# Altium footprint library Maxwell_LIB.PcbLib: 143 footprints (part 1 of 9)
Each footprint in its own frame and in the unit in brackets; x right, y up, seen from the top. Pads: shape width x height; smd on the part's side, far side on the other; paste and mask are expansions set on the pad; w line width, h text height; cw(c..) or ccw(c..) is an arc to the next point about the centre after c.
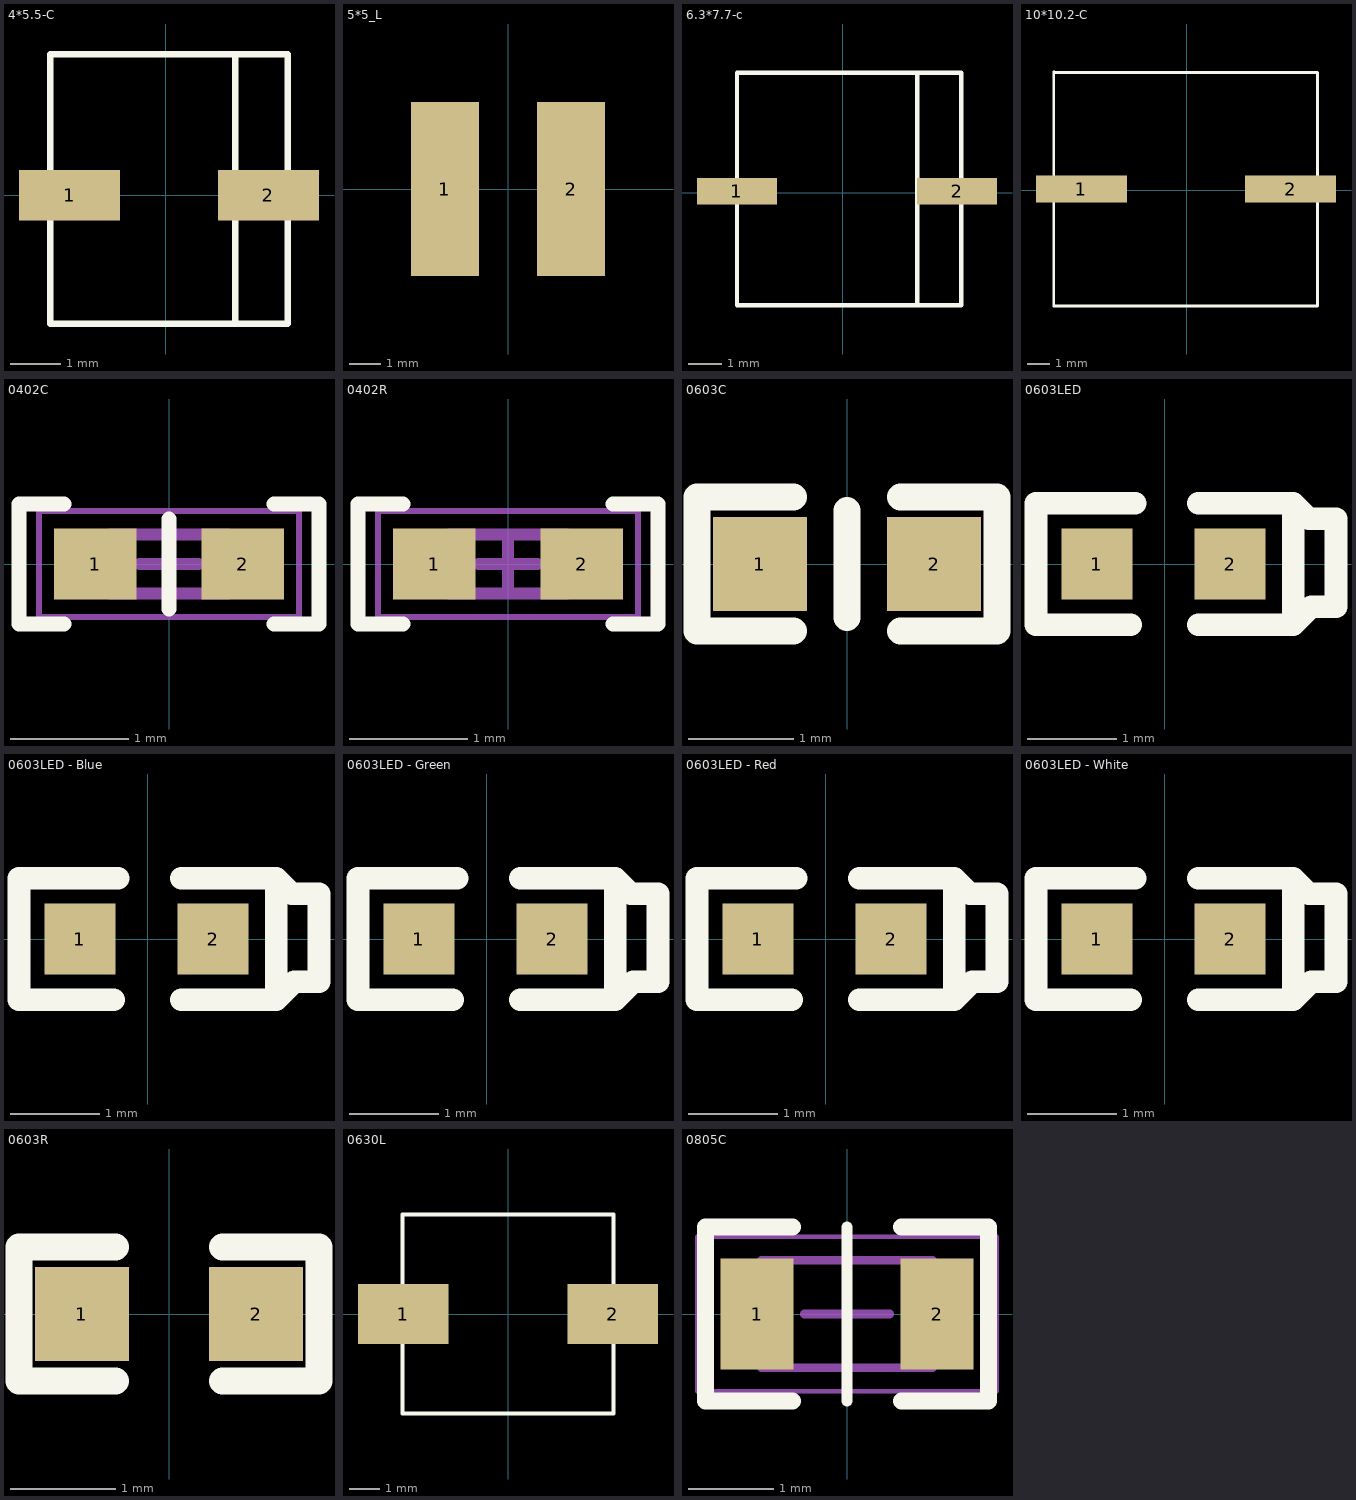
[diagram p0: the footprints below, top view; thin cyan lines are the x and y axes]

## 4*5.5-C [mm]
pads (2):
  rect 2x1 smd: 1(-1.905,0) 2(2.032,0)
Top Overlay:
  lines w0.127: 1.372,-2.54 1.372,2.794 ; -2.286,-2.54 -2.286,0.635 -2.286,2.794 2.413,2.794 2.413,0.635 2.413,-2.54 -2.286,-2.54
3D body "4_5.5.STEP": height 5.52, standoff -0.4, extent -2.819,-2.032 2.819,2.287

## 5*5.5-C [mm]
3D body "User Library-capacitor size C.step": height 5.41, standoff -0.01, extent -2.65,-2.95 2.65,2.95

## 5*5_L [mm]
pads (2):
  rect 2.15x5.5 smd: 1(-2,0) 2(2,0)
3D body "l4x4.STEP": height 1, standoff -0.02, extent -2.002,-2 2.002,2

## 6.3*7.7-c [mm]
pads (2):
  rect 2.4x0.8 smd: 1(-3.175,0.051) 2(3.429,0.051)
Top Overlay:
  lines w0.127: 2.235,-3.378 2.235,3.607 ; -3.175,-3.378 -3.175,0.051 -3.175,3.607 3.556,3.607 3.556,0.051 3.556,-3.378 -3.175,-3.378
3D body "6.3_7.7.STEP": height 7.7, standoff 0, extent -3.498,-3.224 3.802,3.376

## 10*10.2-C [mm]
pads (2):
  rect 4x1.2 smd: 1(-4.625,0.051) 2(4.575,0.051)
Top Overlay:
  lines w0.127: -5.842,-5.105 5.766,-5.105 5.766,5.182 -5.817,5.182 -5.842,5.207 -5.842,-5.105
3D body "User Library-capacitor size G.step": height 10.21, standoff -0.01, extent -5.825,-5.099 5.775,5.201

## 0402C [mm] "Chip Resistor, 2-Leads, Body 1.00x0.50mm, IPC Medium Density"
height 0.3
pads (2):
  rect 0.7x0.6 smd: 1(-0.625,0) 2(0.625,0)
Top Overlay:
  lines w0.127: -0.889,-0.508 -1.27,-0.508 -1.27,0.508 -0.889,0.508 ; 0,-0.381 0,0.381 ; 0.889,-0.508 1.27,-0.508 1.27,0.508 0.889,0.508
Mechanical 13:
  lines w0.1: -0.5,-0.25 -0.5,0.25 0.5,0.25 0.5,-0.25 -0.5,-0.25
Mechanical 15:
  lines w0.05: -1.1,-0.45 -1.1,0.45 1.1,0.45 1.1,-0.45 -1.1,-0.45
  lines w0.1: -0.25,0 0.25,0 ; 0,-0.25 0,0.25
3D body: height 0.3, standoff 0, extent -0.3,-0.25 0.3,0.25
3D body: height 0.3, standoff 0, extent -0.5,-0.25 -0.3,0.25
3D body: height 0.3, standoff 0, extent 0.3,-0.25 0.5,0.25

## 0402R [mm] "Chip Resistor, 2-Leads, Body 1.00x0.50mm, IPC Medium Density"
height 0.3
pads (2):
  rect 0.7x0.6 smd: 1(-0.625,0) 2(0.625,0)
Top Overlay:
  lines w0.127: -0.889,-0.508 -1.27,-0.508 -1.27,0.508 -0.889,0.508 ; 0.889,-0.508 1.27,-0.508 1.27,0.508 0.889,0.508
Mechanical 13:
  lines w0.1: -0.5,-0.25 -0.5,0.25 0.5,0.25 0.5,-0.25 -0.5,-0.25
Mechanical 15:
  lines w0.05: -1.1,-0.45 -1.1,0.45 1.1,0.45 1.1,-0.45 -1.1,-0.45
  lines w0.1: -0.25,0 0.25,0 ; 0,-0.25 0,0.25
3D body: height 0.3, standoff 0, extent -0.3,-0.25 0.3,0.25
3D body: height 0.3, standoff 0, extent -0.5,-0.25 -0.3,0.25
3D body: height 0.3, standoff 0, extent 0.3,-0.25 0.5,0.25

## 0603C [mil]
pads (2):
  rect 35x35 smd: 1(-32.5,0) 2(32.5,0)
Top Overlay:
  lines w10: -20,-25 -56,-25 -56,25 -20,25 ; 0,-20 0,20 ; 20,-25 56,-25 56,25 20,25
Mechanical 15:
  lines w2: 29.21,-1.42 39.21,-1.42 ; 34.21,-6.42 34.21,-1.42 34.21,3.58
3D body "c0603c689c5gac7867.stp": height 17.72, standoff 0, extent -31.5,-16 31.5,15.5

## 0603LED [mm]
pads (2):
  rect 0.8x0.8 smd: 1(-0.762,0) 2(0.738,0)
Top Overlay:
  lines w0.254: -0.381,-0.686 -1.448,-0.686 -1.448,0.686 -0.33,0.686 ; 0.381,-0.686 1.448,-0.686 ; 0.381,0.686 1.448,0.686 ; 1.448,-0.686 1.651,-0.483 1.93,-0.483 1.93,0.508 1.626,0.508 1.448,0.686 ; 1.448,-0.686 1.448,0.686
3D body "0603led_green.STEP": height 0.6, standoff 0, extent -0.8,-0.4 0.8,0.4

## 0603LED - Blue [mm]
pads (2):
  rect 0.8x0.8 smd: 1(-0.762,0) 2(0.738,0)
Top Overlay:
  lines w0.254: -0.381,-0.686 -1.448,-0.686 -1.448,0.686 -0.33,0.686 ; 0.381,-0.686 1.448,-0.686 ; 0.381,0.686 1.448,0.686 ; 1.448,-0.686 1.651,-0.483 1.93,-0.483 1.93,0.508 1.626,0.508 1.448,0.686 ; 1.448,-0.686 1.448,0.686
3D body "LED_0603_B.STEP": height 0.6, standoff 0, extent -0.8,-0.4 0.8,0.4

## 0603LED - Green [mm]
pads (2):
  rect 0.8x0.8 smd: 1(-0.762,0) 2(0.738,0)
Top Overlay:
  lines w0.254: -0.381,-0.686 -1.448,-0.686 -1.448,0.686 -0.33,0.686 ; 0.381,-0.686 1.448,-0.686 ; 0.381,0.686 1.448,0.686 ; 1.448,-0.686 1.651,-0.483 1.93,-0.483 1.93,0.508 1.626,0.508 1.448,0.686 ; 1.448,-0.686 1.448,0.686
3D body "0603led_green.STEP": height 0.6, standoff 0, extent -0.8,-0.4 0.8,0.4

## 0603LED - Red [mm]
pads (2):
  rect 0.8x0.8 smd: 1(-0.762,0) 2(0.738,0)
Top Overlay:
  lines w0.254: -0.381,-0.686 -1.448,-0.686 -1.448,0.686 -0.33,0.686 ; 0.381,-0.686 1.448,-0.686 ; 0.381,0.686 1.448,0.686 ; 1.448,-0.686 1.448,0.686 ; 1.448,-0.686 1.651,-0.483 1.93,-0.483 1.93,0.508 1.626,0.508 1.448,0.686
3D body "LED_0603_R.STEP": height 0.6, standoff 0, extent -0.8,-0.4 0.8,0.4

## 0603LED - White [mm]
pads (2):
  rect 0.8x0.8 smd: 1(-0.762,0) 2(0.738,0)
Top Overlay:
  lines w0.254: -0.381,-0.686 -1.448,-0.686 -1.448,0.686 -0.33,0.686 ; 0.381,-0.686 1.448,-0.686 ; 0.381,0.686 1.448,0.686 ; 1.448,-0.686 1.448,0.686 ; 1.448,-0.686 1.651,-0.483 1.93,-0.483 1.93,0.508 1.626,0.508 1.448,0.686
3D body "LED_0603_W.STEP": height 0.6, standoff 0, extent -0.8,-0.4 0.8,0.4

## 0603R [mil]
pads (2):
  rect 35x35 smd: 1(-32.5,0) 2(32.5,0)
Top Overlay:
  lines w10: -20,-25 -56,-25 -56,25 -20,25 ; 20,-25 56,-25 56,25 20,25
Mechanical 15:
  lines w2: 29.21,-1.42 39.21,-1.42 ; 34.21,-6.42 34.21,-1.42 34.21,3.58
3D body "R 0603.STEP": height 15.79, standoff -0.13, extent -31.49,-15.74 31.5,15.75

## 0630L [mm]
pads (2):
  rect 3x2 smd: 1(-3.48,0) 2(3.48,0)
Top Overlay:
  lines w0.127: -3.5,-3.3 -3.5,3.3 3.5,3.3 3.5,-3.3 -3.5,-3.3
3D body "User Library-LQH88P (3131 Size)_marking.STEP": height 3.8, standoff 0, extent -4,-4 4,4

## 0805C [mm] "Chip Resistor, 2-Leads, Body 2.00x1.25mm, IPC Medium Density"
height 0.5
pads (2):
  rect 0.85x1.3 smd: 1(-1.05,0) 2(1.05,0)
Top Overlay:
  lines w0.127: 0,-1.016 0,1.016
  lines w0.2: -0.635,-1.016 -1.651,-1.016 -1.651,1.016 -0.635,1.016 ; 0.635,-1.016 1.651,-1.016 1.651,1.016 0.635,1.016
Mechanical 13:
  lines w0.1: -1,-0.625 -1,0.625 1,0.625 1,-0.625 -1,-0.625
Mechanical 15:
  lines w0.05: -1.75,-0.9 -1.75,0.9 1.75,0.9 1.75,-0.9 -1.75,-0.9
  lines w0.1: -0.5,0 0.5,0 ; 0,-0.5 0,0.5
3D body: height 1.25, standoff 0, extent -0.508,-0.625 0.508,0.625
3D body: height 1.25, standoff 0, extent -1,-0.625 -0.508,0.625
3D body: height 1.25, standoff 0, extent 0.508,-0.625 1,0.625